# Altium integrated library Cap-Cer-SMD_V2.IntLib: 957 symbols (part 1 of 7)
Pins are listed as number, name and electrical type; pins without a type are passive.

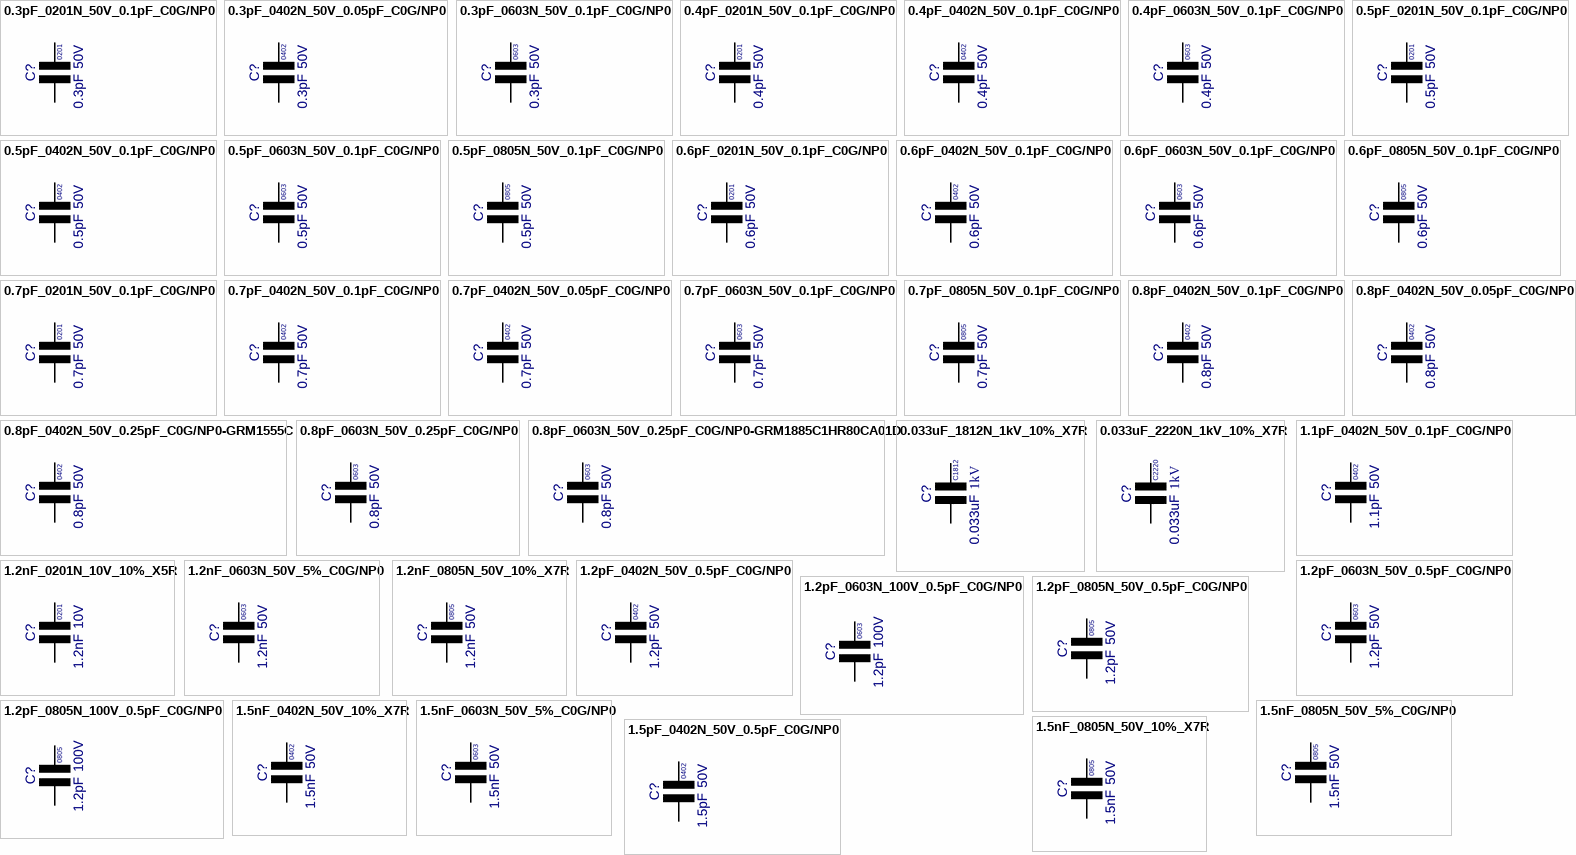
[diagram p0: symbols 0.3pF_0201N_50V_0.1pF_C0G/NP0 to 1.5pF_0402N_50V_0.5pF_C0G/NP0]

## 0.3pF_0201N_50V_0.1pF_C0G/NP0
designator C?  value 0.3pF  Voltage: 50V  Text1: 0201  (hidden comment: 0.3pF_0201N_50V_0.1pF_C0G/NP0)
Cap Ceramic C0G/NP0; Manufacturer: Various; Part Number: 0.3pF 0201 50V 0.1pF C0G/NP0; Tol: 0.1pF; Package: CAPC0201X33N; EDM-PN: *; Text2: *; SAAB PN: *; DCE Part No: *
footprint CAPC0201X33N (Chip Capacitor, 0201, 2-Leads, Body 0.6x0.3mm, IPC Medium Density)
pins: 1, 2

## 0.3pF_0402N_50V_0.05pF_C0G/NP0
designator C?  value 0.3pF  Voltage: 50V  Text1: 0402  (hidden comment: 0.3pF_0402N_50V_0.05pF_C0G/NP0)
Cap Ceramic C0G/NP0; Manufacturer: Various; Part Number: 0.3pF 0402 50V 0.05pF C0G/NP0; Tol: 0.05pF; Package: CAPC0402X60N; EDM-PN: *; Text2: *; SAAB PN: *; DCE Part No: *
footprint CAPC0402X60N (Chip Capacitor, 0402, 2-Leads, Body 1.0x0.5mm, IPC Medium Density)
pins: 1, 2

## 0.3pF_0603N_50V_0.1pF_C0G/NP0
designator C?  value 0.3pF  Voltage: 50V  Text1: 0603  (hidden comment: 0.3pF_0603N_50V_0.1pF_C0G/NP0)
Cap Ceramic C0G/NP0; Manufacturer: Various; Part Number: 0.3pF 0603 50V 0.1pF C0G/NP0; Tol: 0.1pF; Package: CAPC0603X85N; EDM-PN: *; Text2: *; SAAB PN: *; DCE Part No: *
footprint CAPC0603X85N (Chip Capacitor, 0603, 2-Leads, Body 1.6x0.8mm, IPC Medium Density)
pins: 1, 2

## 0.4pF_0201N_50V_0.1pF_C0G/NP0
designator C?  value 0.4pF  Voltage: 50V  Text1: 0201  (hidden comment: 0.4pF_0201N_50V_0.1pF_C0G/NP0)
Cap Ceramic C0G/NP0; Manufacturer: Various; Part Number: 0.4pF 0201 50V 0.1pF C0G/NP0; Tol: 0.1pF; Package: CAPC0201X33N; EDM-PN: *; Text2: *; SAAB PN: *; DCE Part No: *
footprint CAPC0201X33N (Chip Capacitor, 0201, 2-Leads, Body 0.6x0.3mm, IPC Medium Density)
pins: 1, 2

## 0.4pF_0402N_50V_0.1pF_C0G/NP0
designator C?  value 0.4pF  Voltage: 50V  Text1: 0402  (hidden comment: 0.4pF_0402N_50V_0.1pF_C0G/NP0)
Cap Ceramic C0G/NP0; Manufacturer: Various; Part Number: 0.4pF 0402 50V 0.1pF C0G/NP0; Tol: 0.1pF; Package: CAPC0402X60N; EDM-PN: *; Text2: *; SAAB PN: *; DCE Part No: *
footprint CAPC0402X60N (Chip Capacitor, 0402, 2-Leads, Body 1.0x0.5mm, IPC Medium Density)
pins: 1, 2

## 0.4pF_0603N_50V_0.1pF_C0G/NP0
designator C?  value 0.4pF  Voltage: 50V  Text1: 0603  (hidden comment: 0.4pF_0603N_50V_0.1pF_C0G/NP0)
Cap Ceramic C0G/NP0; Manufacturer: Various; Part Number: 0.4pF 0603 50V 0.1pF C0G/NP0; Tol: 0.1pF; Package: CAPC0603X85N; EDM-PN: *; Text2: *; SAAB PN: *; DCE Part No: *
footprint CAPC0603X85N (Chip Capacitor, 0603, 2-Leads, Body 1.6x0.8mm, IPC Medium Density)
pins: 1, 2

## 0.5pF_0201N_50V_0.1pF_C0G/NP0
designator C?  value 0.5pF  Voltage: 50V  Text1: 0201  (hidden comment: 0.5pF_0201N_50V_0.1pF_C0G/NP0)
Cap Ceramic C0G/NP0; Manufacturer: Various; Part Number: 0.5pF 0201 50V 0.1pF C0G/NP0; Tol: 0.1pF; Package: CAPC0201X33N; EDM-PN: *; Text2: *; SAAB PN: *; DCE Part No: *
footprint CAPC0201X33N (Chip Capacitor, 0201, 2-Leads, Body 0.6x0.3mm, IPC Medium Density)
pins: 1, 2

## 0.5pF_0402N_50V_0.1pF_C0G/NP0
designator C?  value 0.5pF  Voltage: 50V  Text1: 0402  (hidden comment: 0.5pF_0402N_50V_0.1pF_C0G/NP0)
Cap Ceramic C0G/NP0; Manufacturer: Various; Part Number: 0.5pF 0402 50V 0.1pF C0G/NP0; Tol: 0.1pF; Package: CAPC0402X60N; EDM-PN: *; Text2: *; SAAB PN: *; DCE Part No: *
footprint CAPC0402X60N (Chip Capacitor, 0402, 2-Leads, Body 1.0x0.5mm, IPC Medium Density)
pins: 1, 2

## 0.5pF_0603N_50V_0.1pF_C0G/NP0
designator C?  value 0.5pF  Voltage: 50V  Text1: 0603  (hidden comment: 0.5pF_0603N_50V_0.1pF_C0G/NP0)
Cap Ceramic C0G/NP0; Manufacturer: Various; Part Number: 0.5pF 0603 50V 0.1pF C0G/NP0; Tol: 0.1pF; Package: CAPC0603X85N; EDM-PN: *; Text2: *; SAAB PN: *; DCE Part No: *
footprint CAPC0603X85N (Chip Capacitor, 0603, 2-Leads, Body 1.6x0.8mm, IPC Medium Density)
pins: 1, 2

## 0.5pF_0805N_50V_0.1pF_C0G/NP0
designator C?  value 0.5pF  Voltage: 50V  Text1: 0805  (hidden comment: 0.5pF_0805N_50V_0.1pF_C0G/NP0)
Cap Ceramic C0G/NP0; Manufacturer: Various; Part Number: 0.5pF 0805 50V 0.1pF C0G/NP0; Tol: 0.1pF; Package: CAPC0805X110N; EDM-PN: *; Text2: *; SAAB PN: *; DCE Part No: *
footprint CAPC0805X110N (Chip Capacitor, 0805, 2-Leads, Body 2.0x1.3mm, IPC Medium Density)
pins: 1, 2

## 0.6pF_0201N_50V_0.1pF_C0G/NP0
designator C?  value 0.6pF  Voltage: 50V  Text1: 0201  (hidden comment: 0.6pF_0201N_50V_0.1pF_C0G/NP0)
Cap Ceramic C0G/NP0; Manufacturer: Various; Part Number: 0.6pF 0201 50V 0.1pF C0G/NP0; Tol: 0.1pF; Package: CAPC0201X33N; EDM-PN: *; Text2: *; SAAB PN: *; DCE Part No: *
footprint CAPC0201X33N (Chip Capacitor, 0201, 2-Leads, Body 0.6x0.3mm, IPC Medium Density)
pins: 1, 2

## 0.6pF_0402N_50V_0.1pF_C0G/NP0
designator C?  value 0.6pF  Voltage: 50V  Text1: 0402  (hidden comment: 0.6pF_0402N_50V_0.1pF_C0G/NP0)
Cap Ceramic C0G/NP0; Manufacturer: Various; Part Number: 0.6pF 0402 50V 0.1pF C0G/NP0; Tol: 0.1pF; Package: CAPC0402X60N; EDM-PN: *; Text2: *; SAAB PN: *; DCE Part No: *
footprint CAPC0402X60N (Chip Capacitor, 0402, 2-Leads, Body 1.0x0.5mm, IPC Medium Density)
pins: 1, 2

## 0.6pF_0603N_50V_0.1pF_C0G/NP0
designator C?  value 0.6pF  Voltage: 50V  Text1: 0603  (hidden comment: 0.6pF_0603N_50V_0.1pF_C0G/NP0)
Cap Ceramic C0G/NP0; Manufacturer: Various; Part Number: 0.6pF 0603 50V 0.1pF C0G/NP0; Tol: 0.1pF; Package: CAPC0603X85N; EDM-PN: *; Text2: *; SAAB PN: *; DCE Part No: *
footprint CAPC0603X85N (Chip Capacitor, 0603, 2-Leads, Body 1.6x0.8mm, IPC Medium Density)
pins: 1, 2

## 0.6pF_0805N_50V_0.1pF_C0G/NP0
designator C?  value 0.6pF  Voltage: 50V  Text1: 0805  (hidden comment: 0.6pF_0805N_50V_0.1pF_C0G/NP0)
Cap Ceramic C0G/NP0; Manufacturer: Various; Part Number: 0.6pF 0805 50V 0.1pF C0G/NP0; Tol: 0.1pF; Package: CAPC0805X110N; EDM-PN: *; Text2: *; SAAB PN: *; DCE Part No: *
footprint CAPC0805X110N (Chip Capacitor, 0805, 2-Leads, Body 2.0x1.3mm, IPC Medium Density)
pins: 1, 2

## 0.7pF_0201N_50V_0.1pF_C0G/NP0
designator C?  value 0.7pF  Voltage: 50V  Text1: 0201  (hidden comment: 0.7pF_0201N_50V_0.1pF_C0G/NP0)
Cap Ceramic C0G/NP0; Manufacturer: Various; Part Number: 0.7pF 0201 50V 0.1pF C0G/NP0; Tol: 0.1pF; Package: CAPC0201X33N; EDM-PN: *; Text2: *; SAAB PN: *; DCE Part No: *
footprint CAPC0201X33N (Chip Capacitor, 0201, 2-Leads, Body 0.6x0.3mm, IPC Medium Density)
pins: 1, 2

## 0.7pF_0402N_50V_0.1pF_C0G/NP0
designator C?  value 0.7pF  Voltage: 50V  Text1: 0402  (hidden comment: 0.7pF_0402N_50V_0.1pF_C0G/NP0)
Cap Ceramic C0G/NP0; Manufacturer: Various; Part Number: 0.7pF 0402 50V 0.1pF C0G/NP0; Tol: 0.1pF; Package: CAPC0402X60N; EDM-PN: *; Text2: *; SAAB PN: *; DCE Part No: *
footprint CAPC0402X60N (Chip Capacitor, 0402, 2-Leads, Body 1.0x0.5mm, IPC Medium Density)
pins: 1, 2

## 0.7pF_0402N_50V_0.05pF_C0G/NP0
designator C?  value 0.7pF  Voltage: 50V  Text1: 0402  (hidden comment: 0.7pF_0402N_50V_0.05pF_C0G/NP0)
Cap Ceramic C0G/NP0; Manufacturer: Various; Part Number: 0.7pF 0402 50V 0.05pF C0G/NP0; DCE Part No: 9708; Tol: 0.05pF; Package: CAPC0402X60N; EDM-PN: *; Text2: *; SAAB PN: *
footprint CAPC0402X60N (Chip Capacitor, 0402, 2-Leads, Body 1.0x0.5mm, IPC Medium Density)
pins: 1, 2

## 0.7pF_0603N_50V_0.1pF_C0G/NP0
designator C?  value 0.7pF  Voltage: 50V  Text1: 0603  (hidden comment: 0.7pF_0603N_50V_0.1pF_C0G/NP0)
Cap Ceramic C0G/NP0; Manufacturer: Various; Part Number: 0.7pF 0603 50V 0.1pF C0G/NP0; Tol: 0.1pF; Package: CAPC0603X85N; EDM-PN: *; Text2: *; SAAB PN: *; DCE Part No: *
footprint CAPC0603X85N (Chip Capacitor, 0603, 2-Leads, Body 1.6x0.8mm, IPC Medium Density)
pins: 1, 2

## 0.7pF_0805N_50V_0.1pF_C0G/NP0
designator C?  value 0.7pF  Voltage: 50V  Text1: 0805  (hidden comment: 0.7pF_0805N_50V_0.1pF_C0G/NP0)
Cap Ceramic C0G/NP0; Manufacturer: Various; Part Number: 0.7pF 0805 50V 0.1pF C0G/NP0; Tol: 0.1pF; Package: CAPC0805X110N; EDM-PN: *; Text2: *; SAAB PN: *; DCE Part No: *
footprint CAPC0805X110N (Chip Capacitor, 0805, 2-Leads, Body 2.0x1.3mm, IPC Medium Density)
pins: 1, 2

## 0.8pF_0402N_50V_0.1pF_C0G/NP0
designator C?  value 0.8pF  Voltage: 50V  Text1: 0402  (hidden comment: 0.8pF_0402N_50V_0.1pF_C0G/NP0)
Cap Ceramic C0G/NP0; Manufacturer: Various; Part Number: 0.8pF 0402 50V 0.1pF C0G/NP0; EDM-PN: CAP1249; Tol: 0.1pF; Package: CAPC0402X60N; Text2: *; SAAB PN: *; DCE Part No: *
footprint CAPC0402X60N (Chip Capacitor, 0402, 2-Leads, Body 1.0x0.5mm, IPC Medium Density)
pins: 1, 2

## 0.8pF_0402N_50V_0.05pF_C0G/NP0
designator C?  value 0.8pF  Voltage: 50V  Text1: 0402  (hidden comment: 0.8pF_0402N_50V_0.05pF_C0G/NP0)
Cap Ceramic C0G/NP0; Manufacturer: Various; Part Number: 0.8pF 0402 50V 0.1pF C0G/NP0; EDM-PN: CAP1249; Tol: 0.05pF; Package: CAPC0402X60N; Text2: *; SAAB PN: *; DCE Part No: *
footprint CAPC0402X60N (Chip Capacitor, 0402, 2-Leads, Body 1.0x0.5mm, IPC Medium Density)
pins: 1, 2

## 0.8pF_0402N_50V_0.25pF_C0G/NP0-GRM1555C
designator C?, comment value 0.8pF  Voltage: 50V  Text1: 0402  (hidden comment: GRM1555C1HR80CA01D)
Cap Ceramic C0G/NP0; Manufacturer: Murata; EDM-PN: CAP874; Tol: 0.25pF; Part Number: GRM1555C1HR80CA01D; Package: GRM155-0.20; Text2: *; SAAB PN: *; DCE Part No: *
footprint GRM155-0.20 (GRM155 0402 1.0x0.5mm)
pins: 1, 2

## 0.8pF_0603N_50V_0.25pF_C0G/NP0
designator C?, comment value 0.8pF  Voltage: 50V  Text1: 0603  (hidden comment: 0.8pF_0603N_50V_0.25pF)
Cap Ceramic C0G/NP0; Manufacturer: Various; Tol: 0.25pF; Part Number: 0.8pF_0603N_50V_0.25pF; Package: CAPC0603X85N; EDM-PN: *; Text2: *; SAAB PN: *; DCE Part No: *
footprint CAPC0603X85N (Chip Capacitor, 0603, 2-Leads, Body 1.6x0.8mm, IPC Medium Density)
pins: 1, 2

## 0.8pF_0603N_50V_0.25pF_C0G/NP0-GRM1885C1HR80CA01D
designator C?, comment value 0.8pF  Voltage: 50V  Text1: 0603  (hidden comment: GRM1885C1HR80CA01D)
Cap Ceramic C0G/NP0; Manufacturer: Murata; Tol: 0.25pF; Part Number: GRM1885C1HR80CA01D; Package: CAPC0603X85N; EDM-PN: *; Text2: *; SAAB PN: *; DCE Part No: *
footprint CAPC0603X85N (Chip Capacitor, 0603, 2-Leads, Body 1.6x0.8mm, IPC Medium Density)
pins: 1, 2

## 0.033uF_1812N_1kV_10%_X7R
designator C?, comment value 0.033uF  Text1: C1812  Voltage: 1kV  (hidden comment: 0.033uF_C1812N_1kV_10%_X7R)
Cap Ceramic X7R; Manufacturer: Various; Part Number: 0.033uF C1812 1kV 10% X7R; Tol: 10%; Package: CAPC1812X190N; EDM-PN: *; Text2: *; SAAB PN: *; DCE Part No: *
footprint CAPC1812X190N (Chip Capacitor, 1812, 2-Leads, Body 4.5x3.2mm, IPC Medium Density)
pins: 1, 2

## 0.033uF_2220N_1kV_10%_X7R
designator C?, comment value 0.033uF  Text1: C2220  Voltage: 1kV  (hidden comment: 0.033uF_C2220N_1kV_10%_X7R)
Cap Ceramic X7R; Manufacturer: Various; Part Number: 0.033uF C2220 1kV 10% X7R; Tol: 10%; Package: CAPC2220x280; EDM-PN: *; Text2: *; SAAB PN: *; DCE Part No: *
footprint CAPC2220x280 (Chip Capacitor, 1825, 2-Leads, Body 5.6x5.0mm)
pins: 1, 2

## 1.1pF_0402N_50V_0.1pF_C0G/NP0
designator C?  value 1.1pF  Voltage: 50V  Text1: 0402  (hidden comment: 1.1pF_0402N_50V_0.1pF_C0G/NP0)
Cap Ceramic C0G/NP0; Manufacturer: Various; Part Number: 1.1pF 0402 50V 0.1pF C0G/NP0; EDM-PN: CAP1387; Tol: 0.1pF; Package: CAPC0402X60N; Text2: *; SAAB PN: *; DCE Part No: *
footprint CAPC0402X60N (Chip Capacitor, 0402, 2-Leads, Body 1.0x0.5mm, IPC Medium Density)
pins: 1, 2

## 1.2nF_0201N_10V_10%_X5R
designator C?, comment value 1.2nF  Voltage: 10V  Text1: 0201  (hidden comment: 1.2nF_C0201_10V_10%_X5R)
Cap Ceramic X5R; Manufacturer: Various; Part Number: 1.2nF 0201 10V 10% X5R; Tol: 10%; Package: CAPC0201X33N; EDM-PN: *; Text2: *; SAAB PN: *; DCE Part No: *
footprint CAPC0201X33N (Chip Capacitor, 0201, 2-Leads, Body 0.6x0.3mm, IPC Medium Density)
pins: 1, 2

## 1.2nF_0603N_50V_5%_C0G/NP0
designator C?, comment value 1.2nF  Voltage: 50V  Text1: 0603  (hidden comment: 1.2nF_C0603_50V_5%_C0G/NP0)
Cap Ceramic C0G/NP0; Manufacturer: Various; Part Number: 1.2nF 0603 50V 5% C0G/NP0; EDM-PN: CAP733; Tol: 5%; Package: CAPC0603X85N; Text2: *; SAAB PN: *; DCE Part No: *
footprint CAPC0603X85N (Chip Capacitor, 0603, 2-Leads, Body 1.6x0.8mm, IPC Medium Density)
pins: 1, 2

## 1.2nF_0805N_50V_10%_X7R
designator C?, comment value 1.2nF  Voltage: 50V  Text1: 0805  (hidden comment: 1.2nF_C0805_50V_10%_X7R)
Cap Ceramic X7R; Manufacturer: Various; Part Number: 1.2nF 0805 50V 10% X7R; Tol: 10%; Package: CAPC0805X110N; EDM-PN: *; Text2: *; SAAB PN: *; DCE Part No: *
footprint CAPC0805X110N (Chip Capacitor, 0805, 2-Leads, Body 2.0x1.3mm, IPC Medium Density)
pins: 1, 2

## 1.2pF_0402N_50V_0.5pF_C0G/NP0
designator C?, comment value 1.2pF  Voltage: 50V  Text1: 0402  (hidden comment: 1.2pF_C0402_50V_0.5_C0G/NP0)
Cap Ceramic C0G/NP0; Manufacturer: Various; Part Number: 1.2pF 0402 50V 0.5pF C0G/NP0; Tol: 0.5pF; Package: CAPC0402X60N; EDM-PN: *; Text2: *; SAAB PN: *; DCE Part No: *
footprint CAPC0402X60N (Chip Capacitor, 0402, 2-Leads, Body 1.0x0.5mm, IPC Medium Density)
pins: 1, 2

## 1.2pF_0603N_50V_0.5pF_C0G/NP0
designator C?, comment value 1.2pF  Voltage: 50V  Text1: 0603  (hidden comment: 1.2pF_C0603_50V_0.5pF_C0G/NP0)
Cap Ceramic C0G/NP0; Manufacturer: Various; Part Number: 1.2pF 0603 50V 0.5pF C0G/NP0; Tol: 0.5pF; Package: CAPC0603X85N; EDM-PN: *; Text2: *; SAAB PN: *; DCE Part No: *
footprint CAPC0603X85N (Chip Capacitor, 0603, 2-Leads, Body 1.6x0.8mm, IPC Medium Density)
pins: 1, 2

## 1.2pF_0603N_100V_0.5pF_C0G/NP0
designator C?  value 1.2pF  Voltage: 100V  Text1: 0603  (hidden comment: 1.2pF_0603N_100V_0.5pF_C0G/NP0)
Cap Ceramic C0G/NP0; Manufacturer: Various; Part Number: 1.2pF 0603 100V 0.5pF C0G/NP0; Tol: 0.5pF; Package: CAPC0603X85N; EDM-PN: *; Text2: *; SAAB PN: *; DCE Part No: *
footprint CAPC0603X85N (Chip Capacitor, 0603, 2-Leads, Body 1.6x0.8mm, IPC Medium Density)
pins: 1, 2

## 1.2pF_0805N_50V_0.5pF_C0G/NP0
designator C?, comment value 1.2pF  Voltage: 50V  Text1: 0805  (hidden comment: 1.2pF_C0805_50V_0.5pF_C0G/NP0)
Cap Ceramic C0G/NP0; Manufacturer: Various; Part Number: 1.2pF 0805 50V 0.5pF C0G/NP0; Tol: 0.5pF; Package: CAPC0805X110N; EDM-PN: *; Text2: *; SAAB PN: *; DCE Part No: *
footprint CAPC0805X110N (Chip Capacitor, 0805, 2-Leads, Body 2.0x1.3mm, IPC Medium Density)
pins: 1, 2

## 1.2pF_0805N_100V_0.5pF_C0G/NP0
designator C?  value 1.2pF  Voltage: 100V  Text1: 0805  (hidden comment: 1.2pF_0805N_100V_0.5pF_C0G/NP0)
Cap Ceramic C0G/NP0; Manufacturer: Various; Part Number: 1.2pF 0805 100V 0.5pF C0G/NP0; Tol: 0.5pF; Package: CAPC0805X110N; EDM-PN: *; Text2: *; SAAB PN: *; DCE Part No: *
footprint CAPC0805X110N (Chip Capacitor, 0805, 2-Leads, Body 2.0x1.3mm, IPC Medium Density)
pins: 1, 2

## 1.5nF_0402N_50V_10%_X7R
designator C?, comment value 1.5nF  Voltage: 50V  Text1: 0402  (hidden comment: 1.5nF_C0402_50V_10%_X7R)
Cap Ceramic X7R; Manufacturer: Various; Part Number: 1.5nF 0402 50V 10% X7R; Tol: 10%; Package: CAPC0402X60N; EDM-PN: *; Text2: *; SAAB PN: *; DCE Part No: *
footprint CAPC0402X60N (Chip Capacitor, 0402, 2-Leads, Body 1.0x0.5mm, IPC Medium Density)
pins: 1, 2

## 1.5nF_0603N_50V_5%_C0G/NP0
designator C?, comment value 1.5nF  Voltage: 50V  Text1: 0603  (hidden comment: 1.5nF_C0603_50V_5%_C0G/NP0)
Cap Ceramic C0G/NP0; Manufacturer: Various; Part Number: 1.5nF 0603 50V 5% C0G/NP0; EDM-PN: CAP1347; Tol: 5%; Package: CAPC0603X85N; Text2: *; SAAB PN: *; DCE Part No: *
footprint CAPC0603X85N (Chip Capacitor, 0603, 2-Leads, Body 1.6x0.8mm, IPC Medium Density)
pins: 1, 2

## 1.5nF_0805N_50V_5%_C0G/NP0
designator C?, comment value 1.5nF  Voltage: 50V  Text1: 0805  (hidden comment: 1.5nF_C0805_50V_5%_C0G/NP0)
Cap Ceramic C0G/NP0; Manufacturer: Various; Part Number: 1.5nF 0805 50V 5% C0G/NP0; Tol: 5%; Package: CAPC0805X110N; EDM-PN: *; Text2: *; SAAB PN: *; DCE Part No: *
footprint CAPC0805X110N (Chip Capacitor, 0805, 2-Leads, Body 2.0x1.3mm, IPC Medium Density)
pins: 1, 2

## 1.5nF_0805N_50V_10%_X7R
designator C?, comment value 1.5nF  Voltage: 50V  Text1: 0805  (hidden comment: 1.5nF_C0805_50V_10%_X7R)
Cap Ceramic X7R; Manufacturer: Various; Part Number: 1.5nF 0805 50V 10% X7R; Tol: 10%; Package: CAPC0805X110N; EDM-PN: *; Text2: *; SAAB PN: *; DCE Part No: *
footprint CAPC0805X110N (Chip Capacitor, 0805, 2-Leads, Body 2.0x1.3mm, IPC Medium Density)
pins: 1, 2

## 1.5pF_0402N_50V_0.5pF_C0G/NP0
designator C?, comment value 1.5pF  Voltage: 50V  Text1: 0402  (hidden comment: 1.5pF_C0402_50V_0.5_C0G/NP0)
Cap Ceramic C0G; Manufacturer: Various; Part Number: 1.5pF 0402 50V 0.5pF C0G/NP0; Tol: 0.5pF; Package: CAPC0402X60N; EDM-PN: *; Text2: *; SAAB PN: *; DCE Part No: *
footprint CAPC0402X60N (Chip Capacitor, 0402, 2-Leads, Body 1.0x0.5mm, IPC Medium Density)
pins: 1, 2

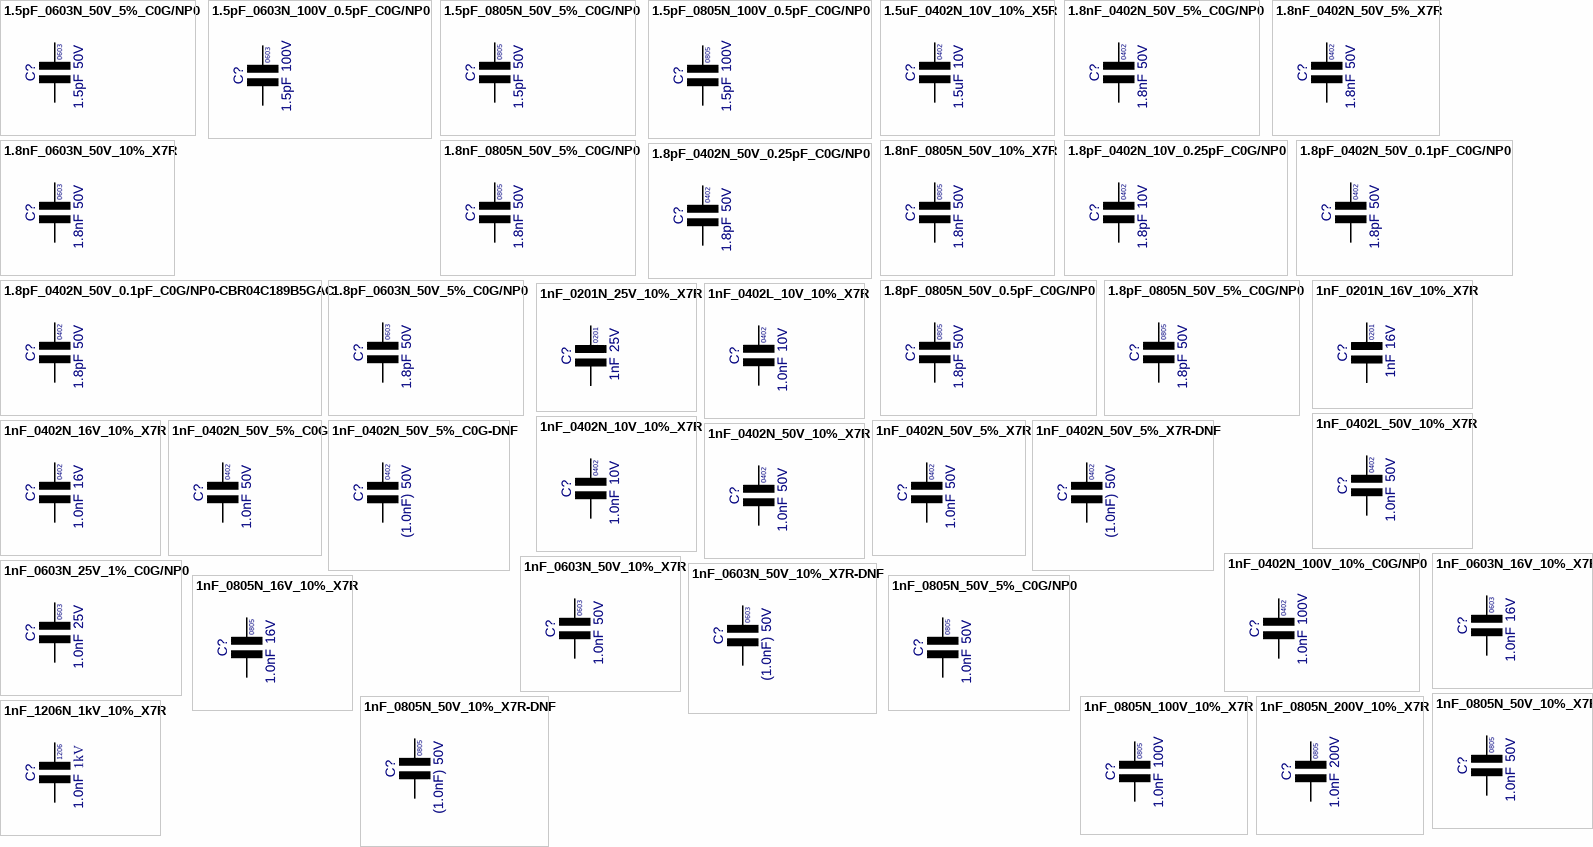
[diagram p1: symbols 1.5pF_0603N_50V_5%_C0G/NP0 to 1nF_1206N_1kV_10%_X7R]

## 1.5pF_0603N_50V_5%_C0G/NP0
designator C?, comment value 1.5pF  Voltage: 50V  Text1: 0603  (hidden comment: 1.5pF_C0603_50V_5%_C0G/NP0)
Cap Ceramic C0G/NP0; Manufacturer: Various; Part Number: 1.5pF 0603 50V 5% C0G/NP0; Tol: 5%; Package: CAPC0603X85N; EDM-PN: *; Text2: *; SAAB PN: *; DCE Part No: *
footprint CAPC0603X85N (Chip Capacitor, 0603, 2-Leads, Body 1.6x0.8mm, IPC Medium Density)
pins: 1, 2

## 1.5pF_0603N_100V_0.5pF_C0G/NP0
designator C?  value 1.5pF  Voltage: 100V  Text1: 0603  (hidden comment: 1.5pF_0603N_100V_0.5pF_C0G/NP0)
Cap Ceramic C0G/NP0; Manufacturer: Various; Part Number: 1.5pF 0603 100V 0.5pF C0G/NP0; Tol: 0.5pF; Package: CAPC0603X85N; EDM-PN: *; Text2: *; SAAB PN: *; DCE Part No: *
footprint CAPC0603X85N (Chip Capacitor, 0603, 2-Leads, Body 1.6x0.8mm, IPC Medium Density)
pins: 1, 2

## 1.5pF_0805N_50V_5%_C0G/NP0
designator C?, comment value 1.5pF  Voltage: 50V  Text1: 0805  (hidden comment: 1.5pF_C0805_50V_5%_C0G/NP0)
Cap Ceramic C0G/NP0; Manufacturer: Various; Part Number: 1.5pF 0805 50V 5% C0G/NP0; Tol: 0.5pF; Package: CAPC0805X110N; EDM-PN: *; Text2: *; SAAB PN: *; DCE Part No: *
footprint CAPC0805X110N (Chip Capacitor, 0805, 2-Leads, Body 2.0x1.3mm, IPC Medium Density)
pins: 1, 2

## 1.5pF_0805N_100V_0.5pF_C0G/NP0
designator C?  value 1.5pF  Voltage: 100V  Text1: 0805  (hidden comment: 1.5pF_0805N_100V_0.5pF_C0G/NP0)
Cap Ceramic C0G/NP0; Manufacturer: Various; Part Number: 1.5pF 0805 100V 0.5pF C0G/NP0; Tol: 0.5pF; Package: CAPC0805X110N; EDM-PN: *; Text2: *; SAAB PN: *; DCE Part No: *
footprint CAPC0805X110N (Chip Capacitor, 0805, 2-Leads, Body 2.0x1.3mm, IPC Medium Density)
pins: 1, 2

## 1.5uF_0402N_10V_10%_X5R
designator C?, comment value 1.5uF  Voltage: 10V  Text1: 0402  (hidden comment: 1.5uF_C0402_10V_10%_X5R)
Cap Ceramic X5R; Manufacturer: Various; Part Number: 1.5uF 0402 10V 10% X5R; Tol: 10%; Package: CAPC0402X60N; EDM-PN: *; Text2: *; SAAB PN: *; DCE Part No: *
footprint CAPC0402X60N (Chip Capacitor, 0402, 2-Leads, Body 1.0x0.5mm, IPC Medium Density)
pins: 1, 2

## 1.8nF_0402N_50V_5%_C0G/NP0
designator C?, comment value 1.8nF  Voltage: 50V  Text1: 0402  (hidden comment: 1.8nF_C0402_50V_5%_C0G/NP0)
Cap Ceramic C0G/NP0; Manufacturer: Various; Part Number: 1.8nF 0402 50V 5% C0G/NP0; Tol: 5%; Package: CAPC0402X60N; EDM-PN: *; Text2: *; SAAB PN: *; DCE Part No: *
footprint CAPC0402X60N (Chip Capacitor, 0402, 2-Leads, Body 1.0x0.5mm, IPC Medium Density)
pins: 1, 2

## 1.8nF_0402N_50V_5%_X7R
designator C?, comment value 1.8nF  Voltage: 50V  Text1: 0402  (hidden comment: 1.8nF_C0402_50V_5%_X7R)
Cap Ceramic X7R; Manufacturer: Various; Part Number: 1.8nF 0402 50V 5% X7R; Tol: 5%; Package: CAPC0402X60N; EDM-PN: *; Text2: *; SAAB PN: *; DCE Part No: *
footprint CAPC0402X60N (Chip Capacitor, 0402, 2-Leads, Body 1.0x0.5mm, IPC Medium Density)
pins: 1, 2

## 1.8nF_0603N_50V_10%_X7R
designator C?, comment value 1.8nF  Voltage: 50V  Text1: 0603  (hidden comment: 1.8nF_C0603_50V_10%_X7R)
Cap Ceramic X7R; Manufacturer: Various; Part Number: 1.8nF 0603 50V 10% X7R; Tol: 10%; Package: CAPC0603X85N; EDM-PN: *; Text2: *; SAAB PN: *; DCE Part No: *
footprint CAPC0603X85N (Chip Capacitor, 0603, 2-Leads, Body 1.6x0.8mm, IPC Medium Density)
pins: 1, 2

## 1.8nF_0805N_50V_5%_C0G/NP0
designator C?, comment value 1.8nF  Voltage: 50V  Text1: 0805  (hidden comment: 1.8nF_C0805_50V_5%_C0G/NP0)
Cap Ceramic C0G/NP0; Manufacturer: Various; Part Number: 1.8nF 0805 50V 5% C0G/NP0; Tol: 5%; Package: CAPC0805X110N; EDM-PN: *; Text2: *; SAAB PN: *; DCE Part No: *
footprint CAPC0805X110N (Chip Capacitor, 0805, 2-Leads, Body 2.0x1.3mm, IPC Medium Density)
pins: 1, 2

## 1.8nF_0805N_50V_10%_X7R
designator C?, comment value 1.8nF  Voltage: 50V  Text1: 0805  (hidden comment: 1.8nF_C0805_50V_10%_X7R)
Cap Ceramic X7R; Manufacturer: Various; Part Number: 1.8nF 0805 50V 10% X7R; EDM-PN: CAP49; Tol: 10%; Package: CAPC0805X110N; Text2: *; SAAB PN: *; DCE Part No: *
footprint CAPC0805X110N (Chip Capacitor, 0805, 2-Leads, Body 2.0x1.3mm, IPC Medium Density)
pins: 1, 2

## 1.8pF_0402N_10V_0.25pF_C0G/NP0
designator C?, comment value 1.8pF  Voltage: 10V  Text1: 0402  (hidden comment: 1.8pF_C0402_10V_0.25_C0G/NP0)
Cap Ceramic C0G/NP0; Manufacturer: Various; Part Number: 1.8pF 0402 10V 0.25 C0G/NP0; Tol: 0.25pF; Package: CAPC0402X60N; EDM-PN: *; Text2: *; SAAB PN: *; DCE Part No: *
footprint CAPC0402X60N (Chip Capacitor, 0402, 2-Leads, Body 1.0x0.5mm, IPC Medium Density)
pins: 1, 2

## 1.8pF_0402N_50V_0.1pF_C0G/NP0
designator C?, comment value 1.8pF  Voltage: 50V  Text1: 0402  (hidden comment: 1.8pF_C0402_50V_0.1pF_C0G/NP0)
Cap Ceramic C0G/NP0; Manufacturer: Various; Part Number: 1.8pF 0402 50V 0.1pF C0G/NP0; Tol: 0.1pF; Package: CAPC0402X60N; EDM-PN: *; Text2: *; SAAB PN: *; DCE Part No: *
footprint CAPC0402X60N (Chip Capacitor, 0402, 2-Leads, Body 1.0x0.5mm, IPC Medium Density)
pins: 1, 2

## 1.8pF_0402N_50V_0.1pF_C0G/NP0-CBR04C189B5GAC
designator C?, comment value 1.8pF  Voltage: 50V  Text1: 0402  (hidden comment: CBR04C189B5GAC)
Cap Ceramic C0G/NP0 HiQ-CBR Series for RF; Manufacturer: Kemet; EDM-PN: CAP1408; Tol: 0.1pF; Part Number: CBR04C189B5GAC; Package: CAPC0402X60N; Text2: *; SAAB PN: *; DCE Part No: *
footprint CAPC0402X60N (Chip Capacitor, 0402, 2-Leads, Body 1.0x0.5mm, IPC Medium Density)
pins: 1, 2

## 1.8pF_0402N_50V_0.25pF_C0G/NP0
designator C?, comment value 1.8pF  Voltage: 50V  Text1: 0402  (hidden comment: 1.8pF_C0402_50V_0.25_C0G/NP0)
Cap Ceramic C0G/NP0; Manufacturer: Various; Part Number: 1.8pF 0402 50V 0.25 C0G/NP0; EDM-PN: CAP937; Tol: 0.25pF; Package: CAPC0402X60N; Text2: *; SAAB PN: *; DCE Part No: *
footprint CAPC0402X60N (Chip Capacitor, 0402, 2-Leads, Body 1.0x0.5mm, IPC Medium Density)
pins: 1, 2

## 1.8pF_0603N_50V_5%_C0G/NP0
designator C?, comment value 1.8pF  Voltage: 50V  Text1: 0603  (hidden comment: 1.8pF_C0603_50V_5%_C0G/NP0)
Cap Ceramic C0G/NP0; Manufacturer: Various; Part Number: 1.8pF 0603 50V 5% C0G/NP0; EDM-PN: CAP1007; Tol: 5%; Package: CAPC0603X85N; Text2: *; SAAB PN: *; DCE Part No: *
footprint CAPC0603X85N (Chip Capacitor, 0603, 2-Leads, Body 1.6x0.8mm, IPC Medium Density)
pins: 1, 2

## 1.8pF_0805N_50V_0.5pF_C0G/NP0
designator C?, comment value 1.8pF  Voltage: 50V  Text1: 0805  (hidden comment: 1.8pF_C0805_50V_0.5pF_C0G/NP0)
Cap Ceramic C0G/NP0; Manufacturer: Various; Part Number: 1.8pF 0805 50V 0.5pF C0G/NP0; Tol: 0.5pF; Package: CAPC0805X110N; EDM-PN: *; Text2: *; SAAB PN: *; DCE Part No: *
footprint CAPC0805X110N (Chip Capacitor, 0805, 2-Leads, Body 2.0x1.3mm, IPC Medium Density)
pins: 1, 2

## 1.8pF_0805N_50V_5%_C0G/NP0
designator C?, comment value 1.8pF  Voltage: 50V  Text1: 0805  (hidden comment: 1.8pF_C0805_50V_5%_C0G/NP0)
Cap Ceramic C0G/NP0; Manufacturer: Various; Part Number: 1.8pF 0805 50V 5% C0G/NP0; Tol: 0.5pF; Package: CAPC0805X110N; EDM-PN: *; Text2: *; SAAB PN: *; DCE Part No: *
footprint CAPC0805X110N (Chip Capacitor, 0805, 2-Leads, Body 2.0x1.3mm, IPC Medium Density)
pins: 1, 2

## 1nF_0201N_16V_10%_X7R
designator C?, comment value 1nF  Voltage: 16V  Text1: 0201  (hidden comment: 1nF_C0201_16V_10%_X7R)
Cap Ceramic X7R; Manufacturer: Various; Part Number: 1nF 0201 16V 10% X7R; Tol: 10%; Package: CAPC0201X33N; EDM-PN: *; Text2: *; SAAB PN: *; DCE Part No: *
footprint CAPC0201X33N (Chip Capacitor, 0201, 2-Leads, Body 0.6x0.3mm, IPC Medium Density)
pins: 1, 2

## 1nF_0201N_25V_10%_X7R
designator C?, comment value 1nF  Voltage: 25V  Text1: 0201  (hidden comment: 1nF_C0201_25V_10%_X7R)
Cap Ceramic X7R; Manufacturer: Various; Part Number: 1nF 0201 25V 10% X7R; Tol: 10%; Package: CAPC0201X33N; EDM-PN: *; Text2: *; SAAB PN: *; DCE Part No: *
footprint CAPC0201X33N (Chip Capacitor, 0201, 2-Leads, Body 0.6x0.3mm, IPC Medium Density)
pins: 1, 2

## 1nF_0402L_10V_10%_X7R
designator C?, comment value 1.0nF  Voltage: 10V  Text1: 0402  (hidden comment: 1.0nF_C0402_10V_10%_X7R)
Cap Ceramic X7R; Manufacturer: Various; Part Number: 1.0nF 0402 10V 10% X7R; Tol: 10%; Package: CAPC0402X60L; EDM-PN: *; Text2: *; SAAB PN: *; DCE Part No: *
footprint CAPC0402X60L (Chip Capacitor, 0402, 2-Leads, Body 1.0x0.5mm, IPC High Density)
pins: 1, 2

## 1nF_0402L_50V_10%_X7R
designator C?, comment value 1.0nF  Voltage: 50V  Text1: 0402  (hidden comment: 1.0nF_C0402_50V_10%_X7R)
Cap Ceramic X7R; Manufacturer: Various; Part Number: 1.0nF 0402 50V 10% X7R; DCE Part No: 7171; EDM-PN: CAP626; Tol: 10%; Package: CAPC0402X60L; Text2: *; SAAB PN: *
footprint CAPC0402X60L (Chip Capacitor, 0402, 2-Leads, Body 1.0x0.5mm, IPC High Density)
pins: 1, 2

## 1nF_0402N_10V_10%_X7R
designator C?, comment value 1.0nF  Voltage: 10V  Text1: 0402  (hidden comment: 1.0nF_C0402_10V_10%_X7R)
Cap Ceramic X7R; Manufacturer: Various; Part Number: 1.0nF 0402 10V 10% X7R; Tol: 10%; Package: CAPC0402X60N; EDM-PN: *; Text2: *; SAAB PN: *; DCE Part No: *
footprint CAPC0402X60N (Chip Capacitor, 0402, 2-Leads, Body 1.0x0.5mm, IPC Medium Density)
pins: 1, 2

## 1nF_0402N_16V_10%_X7R
designator C?, comment value 1.0nF  Voltage: 16V  Text1: 0402  (hidden comment: 1.0nF_C0402_16V_10%_X7R)
Cap Ceramic X7R; Manufacturer: Various; Part Number: 1.0nF 0402 16V 10% X7R; Tol: 10%; Package: CAPC0402X60N; EDM-PN: *; Text2: *; SAAB PN: *; DCE Part No: *
footprint CAPC0402X60N (Chip Capacitor, 0402, 2-Leads, Body 1.0x0.5mm, IPC Medium Density)
pins: 1, 2

## 1nF_0402N_50V_5%_C0G
designator C?, comment value 1.0nF  Voltage: 50V  Text1: 0402  (hidden comment: 1.0nF_C0402_50V_5%_C0G)
Cap Ceramic C0G; Manufacturer: Various; Part Number: 1.0nF 0402 50V 5% C0G; Tol: 5%; Package: CAPC0402X60N; EDM-PN: *; Text2: *; SAAB PN: *; DCE Part No: *
footprint CAPC0402X60N (Chip Capacitor, 0402, 2-Leads, Body 1.0x0.5mm, IPC Medium Density)
pins: 1, 2

## 1nF_0402N_50V_5%_C0G-DNF
designator C?, comment value (1.0nF)  Voltage: 50V  Text1: 0402  (hidden comment: 1.0nF_C0402_50V_5%_C0G-DNF)
Cap Ceramic C0G - Do not Fit; Manufacturer: Various; Part Number: DNF - 1.0nF 0402 50V 5% C0G; Tol: 5%; Package: CAPC0402X60N; EDM-PN: *; Text2: *; SAAB PN: *; DCE Part No: *
footprint CAPC0402X60N (Chip Capacitor, 0402, 2-Leads, Body 1.0x0.5mm, IPC Medium Density)
pins: 1, 2

## 1nF_0402N_50V_5%_X7R
designator C?, comment value 1.0nF  Voltage: 50V  Text1: 0402  (hidden comment: 1.0nF_C0402_50V_5%_X7R)
Cap Ceramic X7R; Manufacturer: Various; Part Number: 1.0nF 0402 50V 5% X7R; EDM-PN: CAP794; Tol: 5%; Reutech PN: 5910-CA-0427; Package: CAPC0402X60N; Text2: *; SAAB PN: *; DCE Part No: *
footprint CAPC0402X60N (Chip Capacitor, 0402, 2-Leads, Body 1.0x0.5mm, IPC Medium Density)
pins: 1, 2

## 1nF_0402N_50V_5%_X7R-DNF
designator C?, comment value (1.0nF)  Voltage: 50V  Text1: 0402  (hidden comment: 1.0nF_C0402_50V_5%_X7R-DNF)
Cap Ceramic X7R - Do not Fit; Manufacturer: Various; Part Number: DNF - 1.0nF 0402 50V 5% X7R; EDM-PN: CAP794; Tol: 5%; Package: CAPC0402X60N; Text2: *; SAAB PN: *; DCE Part No: *
footprint CAPC0402X60N (Chip Capacitor, 0402, 2-Leads, Body 1.0x0.5mm, IPC Medium Density)
pins: 1, 2

## 1nF_0402N_50V_10%_X7R
designator C?, comment value 1.0nF  Voltage: 50V  Text1: 0402  (hidden comment: 1.0nF_C0402_50V_10%_X7R)
Cap Ceramic X7R; Manufacturer: Various; Part Number: 1.0nF 0402 50V 10% X7R; DCE Part No: 7171; EDM-PN: CAP626; Tol: 10%; Package: CAPC0402X60N; Text2: *; SAAB PN: *
footprint CAPC0402X60N (Chip Capacitor, 0402, 2-Leads, Body 1.0x0.5mm, IPC Medium Density)
pins: 1, 2

## 1nF_0402N_100V_10%_C0G/NP0
designator C?, comment value 1.0nF  Voltage: 100V  Text1: 0402  (hidden comment: 1.0nF_C0402_100V_10%_C0G/NP0)
Cap Ceramic C0G/NP0; Manufacturer: Various; Part Number: 1.0nF 0402 100V 10% C0G/NP0; Tol: 10%; Package: CAPC0402X60N; EDM-PN: *; Text2: *; SAAB PN: *; DCE Part No: *
footprint CAPC0402X60N (Chip Capacitor, 0402, 2-Leads, Body 1.0x0.5mm, IPC Medium Density)
pins: 1, 2

## 1nF_0603N_16V_10%_X7R
designator C?, comment value 1.0nF  Voltage: 16V  Text1: 0603  (hidden comment: 1.0nF_C0603_16V_10%_X7R)
Cap Ceramic X7R; Manufacturer: Various; Part Number: 1.0nF 0603 16V 10% X7R; Tol: 10%; Package: CAPC0603X85N; EDM-PN: *; Text2: *; Reutech PN: *; SAAB PN: *; DCE Part No: *
footprint CAPC0603X85N (Chip Capacitor, 0603, 2-Leads, Body 1.6x0.8mm, IPC Medium Density)
pins: 1, 2

## 1nF_0603N_25V_1%_C0G/NP0
designator C?, comment value 1.0nF  Voltage: 25V  Text1: 0603  (hidden comment: 1.0nF_C0603_25V_1%_C0G/NP0)
Cap Ceramic C0G/NP0; Manufacturer: Various; Part Number: 1.0nF 0603 25V 1% C0G/NP0; Tol: 1%; Reutech PN: 5910-CA-0562; Package: CAPC0603X85N; EDM-PN: *; Text2: *; SAAB PN: *; DCE Part No: *
footprint CAPC0603X85N (Chip Capacitor, 0603, 2-Leads, Body 1.6x0.8mm, IPC Medium Density)
pins: 1, 2

## 1nF_0603N_50V_10%_X7R
designator C?, comment value 1.0nF  Voltage: 50V  Text1: 0603  (hidden comment: 1.0nF_C0603_50V_10%_X7R)
Cap Ceramic X7R; Manufacturer: Various; Part Number: 1.0nF 0603 50V 10% X7R; EDM-PN: CAP364; Tol: 10%; Reutech PN: 5910-CA-0401; Package: CAPC0603X85N; Text2: *; SAAB PN: *; DCE Part No: *
footprint CAPC0603X85N (Chip Capacitor, 0603, 2-Leads, Body 1.6x0.8mm, IPC Medium Density)
pins: 1, 2

## 1nF_0603N_50V_10%_X7R-DNF
designator C?, comment value (1.0nF)  Voltage: 50V  Text1: 0603  (hidden comment: 1.0nF_C0603_50V_10%_X7R)
Cap Ceramic X7R - Do not Fit; Manufacturer: Various; Part Number: DNF - 1.0nF 0603 50V 10% X7R; EDM-PN: CAP364; Tol: 10%; Reutech PN: 5910-CA-0401; Package: CAPC0603X85N; Text2: *; SAAB PN: *; DCE Part No: *
footprint CAPC0603X85N (Chip Capacitor, 0603, 2-Leads, Body 1.6x0.8mm, IPC Medium Density)
pins: 1, 2
